# Altium footprint library JL_PCB.PCBLIB: 1129 footprints (part 50 of 72)
Each footprint in its own frame and in the unit in brackets; x right, y up, seen from the top. Pads: shape width x height; smd on the part's side, far side on the other; paste and mask are expansions set on the pad; w line width, h text height; cw(c..) or ccw(c..) is an arc to the next point about the centre after c.
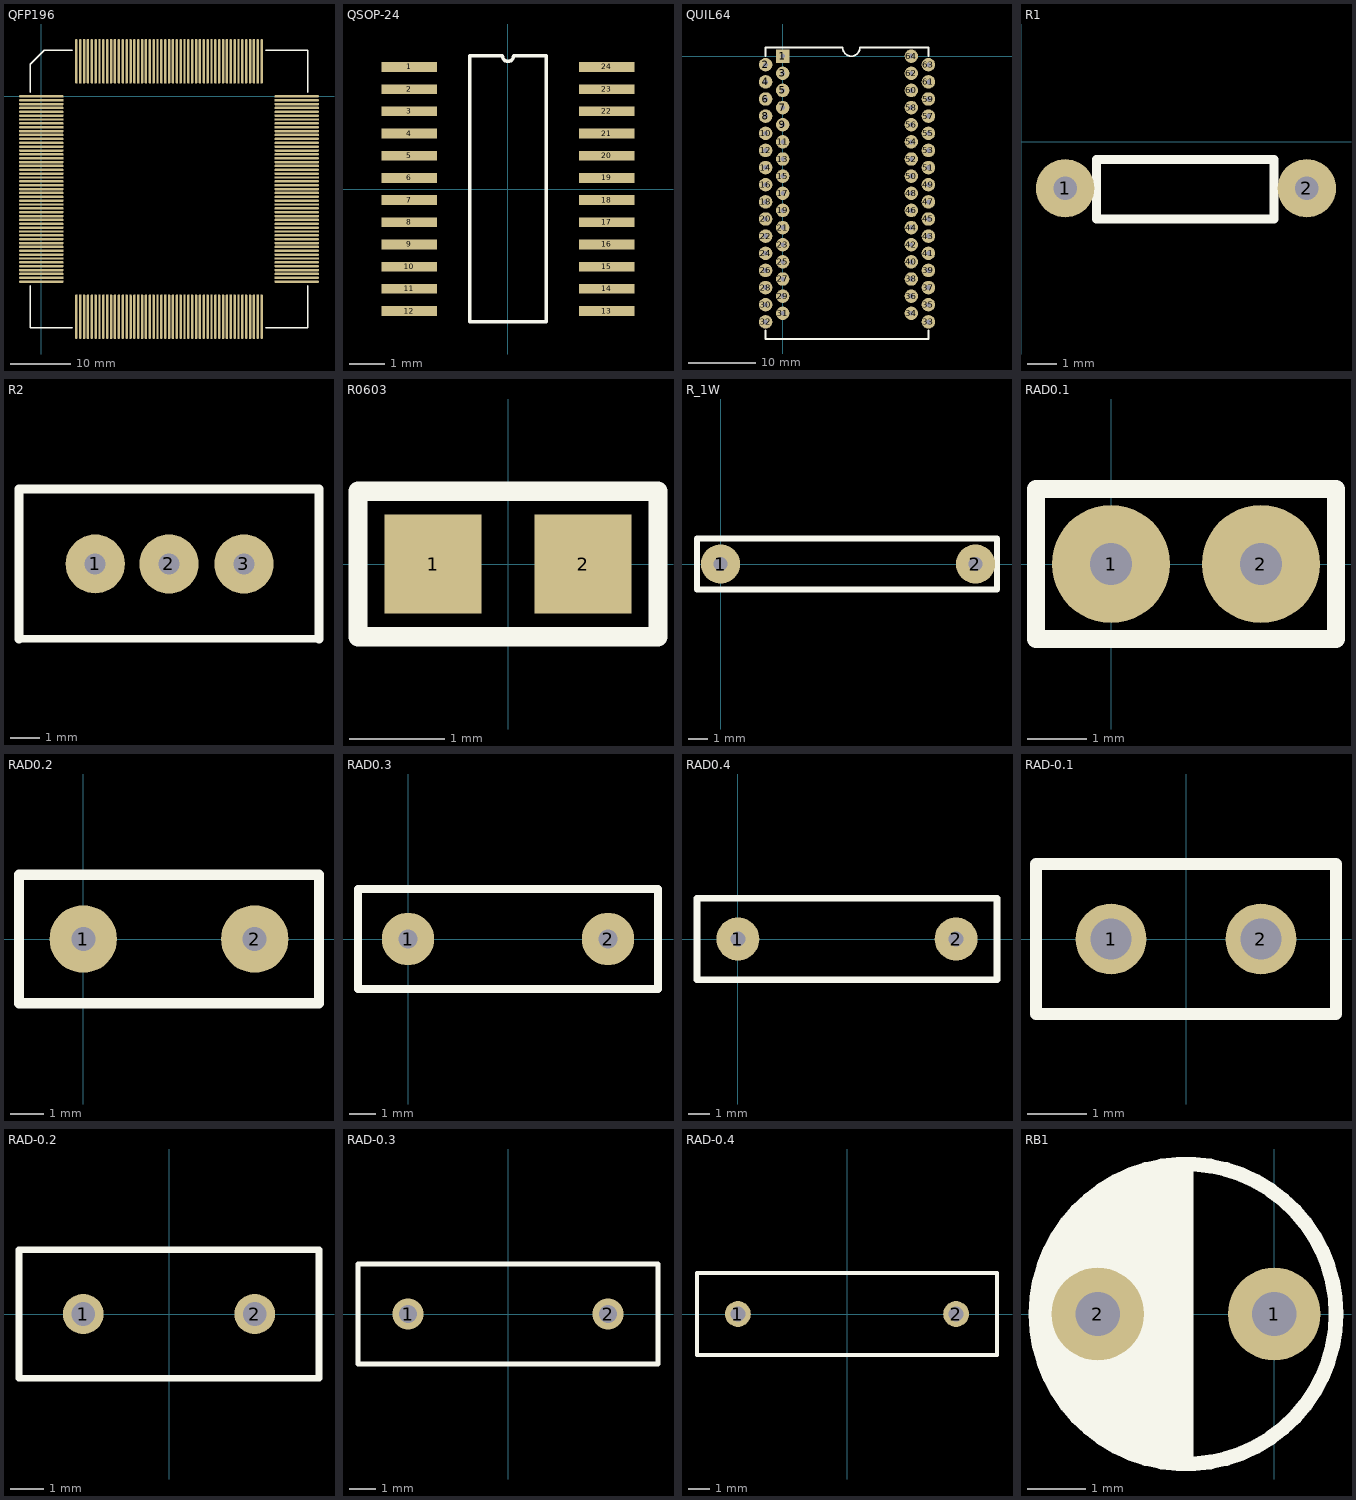
[diagram p49: the footprints below, top view; thin cyan lines are the x and y axes]

## QFP196 [mil]
pads (196):
  oval 290x16 smd: 1(0,0) 2(0,-25) 3(0,-50) 4(0,-75) 5(0,-100) 6(0,-125) 7(0,-150) 8(0,-175) 9(0,-200) 10(0,-225) 11(0,-250) 12(0,-275) 13(0,-301) 14(0,-326) 15(0,-351) 16(0,-376) 17(0,-401) 18(0,-426) 19(0,-451) 20(0,-476) 21(0,-501) 22(0,-526) 23(0,-551) 24(0,-576) 25(0,-601) 26(0,-626) 27(0,-651) 28(0,-676) 29(0,-701) 30(0,-726) 31(0,-751) 32(0,-776) 33(0,-801) 34(0,-826) 35(0,-851) 36(0,-876) 37(0,-901) 38(0,-926) 39(0,-951) 40(0,-976) 41(0,-1001) 42(0,-1026) 43(0,-1051) 44(0,-1076) 45(0,-1101) 46(0,-1126) 47(0,-1151) 48(0,-1176) 49(0,-1201) 99(1655,-1201) 100(1655,-1176) 101(1655,-1151) 102(1655,-1126) 103(1655,-1101) 104(1655,-1076) 105(1655,-1051) 106(1655,-1026) 107(1655,-1001) 108(1655,-976) 109(1655,-951) 110(1655,-926) 111(1655,-901) 112(1655,-876) 113(1655,-851) 114(1655,-826) 115(1655,-801) 116(1655,-776) 117(1655,-751) 118(1655,-726) 119(1655,-701) 120(1655,-676) 121(1655,-651) 122(1655,-626) 123(1655,-601) 124(1655,-576) 125(1655,-551) 126(1655,-526) 127(1655,-501) 128(1655,-476) 129(1655,-451) 130(1655,-426) 131(1655,-401) 132(1655,-376) 133(1655,-351) 134(1655,-326) 135(1655,-301) 136(1655,-275) 137(1655,-250) 138(1655,-225) 139(1655,-200) 140(1655,-175) 141(1655,-150) 142(1655,-125) 143(1655,-100) 144(1655,-75) 145(1655,-50) 146(1655,-25) 147(1655,0)
  oval 16x290 smd: 50(227,-1428) 51(252,-1428) 52(277,-1428) 53(302,-1428) 54(327,-1428) 55(352,-1428) 56(377,-1428) 57(402,-1428) 58(427,-1428) 59(452,-1428) 60(477,-1428) 61(502,-1428) 62(528,-1428) 63(553,-1428) 64(578,-1428) 65(603,-1428) 66(628,-1428) 67(653,-1428) 68(678,-1428) 69(703,-1428) 70(728,-1428) 71(753,-1428) 72(778,-1428) 73(803,-1428) 74(828,-1428) 75(853,-1428) 76(878,-1428) 77(903,-1428) 78(928,-1428) 79(953,-1428) 80(978,-1428) 81(1003,-1428) 82(1028,-1428) 83(1053,-1428) 84(1078,-1428) 85(1103,-1428) 86(1128,-1428) 87(1153,-1428) 88(1178,-1428) 89(1203,-1428) 90(1228,-1428) 91(1253,-1428) 92(1278,-1428) 93(1303,-1428) 94(1328,-1428) 95(1353,-1428) 96(1378,-1428) 97(1403,-1428) 98(1428,-1428) 148(1428,227) 149(1403,227) 150(1378,227) 151(1353,227) 152(1328,227) 153(1303,227) 154(1278,227) 155(1253,227) 156(1228,227) 157(1203,227) 158(1178,227) 159(1153,227) 160(1128,227) 161(1103,227) 162(1078,227) 163(1053,227) 164(1028,227) 165(1003,227) 166(978,227) 167(953,227) 168(928,227) 169(903,227) 170(878,227) 171(853,227) 172(828,227) 173(803,227) 174(778,227) 175(753,227) 176(728,227) 177(703,227) 178(678,227) 179(653,227) 180(628,227) 181(603,227) 182(578,227) 183(553,227) 184(528,227) 185(502,227) 186(477,227) 187(452,227) 188(427,227) 189(402,227) 190(377,227) 191(352,227) 192(327,227) 193(302,227) 194(277,227) 195(252,227) 196(227,227)
TopOverlay:
  lines w10: -72,-1228 -72,-1500 200,-1500 ; -72,27 -72,209 18,299 200,299 ; 1455,-1500 1727,-1500 1727,-1228 ; 1455,299 1727,299 1727,27

## QSOP-24 [mm] "SOP, 24-Leads, Body 8.9x4.1mm (max), Pitch 0.63mm, IPC Medium Density"
height 1.75
pads (24):
  rect 1.6x0.28 smd: 1(-2.825,3.493) 2(-2.825,2.857) 3(-2.825,2.223) 4(-2.825,1.588) 5(-2.825,0.952) 6(-2.825,0.318) 7(-2.825,-0.318) 8(-2.825,-0.953) 9(-2.825,-1.587) 10(-2.825,-2.223) 11(-2.825,-2.857) 12(-2.825,-3.493) 13(2.825,-3.492) 14(2.825,-2.857) 15(2.825,-2.222) 16(2.825,-1.587) 17(2.825,-0.953) 18(2.825,-0.318) 19(2.825,0.318) 20(2.825,0.953) 21(2.825,1.587) 22(2.825,2.222) 23(2.825,2.858) 24(2.825,3.493)
TopOverlay:
  lines w0.1: -1.09,-3.805 1.09,-3.805 1.09,3.81 0.159,3.81 cw(c0,3.81) -0.159,3.81 -1.09,3.81 -1.09,-3.805

## QUIL64 [mm]
pads (64):
  rect 2x2 hole 0.711: 1(0,0)
  round 2 hole 0.711: 2(-2.54,-1.27) 3(0,-2.54) 4(-2.54,-3.81) 5(0,-5.08) 6(-2.54,-6.35) 7(0,-7.62) 8(-2.54,-8.89) 9(0,-10.16) 10(-2.54,-11.43) 11(0,-12.7) 12(-2.54,-13.97) 13(0,-15.24) 14(-2.54,-16.51) 15(0,-17.78) 16(-2.54,-19.05) 17(0,-20.32) 18(-2.54,-21.59) 19(0,-22.86) 20(-2.54,-24.13) 21(0,-25.4) 22(-2.54,-26.67) 23(0,-27.94) 24(-2.54,-29.21) 25(0,-30.48) 26(-2.54,-31.75) 27(0,-33.02) 28(-2.54,-34.29) 29(0,-35.56) 30(-2.54,-36.83) 31(0,-38.1) 32(-2.54,-39.37) 33(21.59,-39.37) 34(19.05,-38.1) 35(21.59,-36.83) 36(19.05,-35.56) 37(21.59,-34.29) 38(19.05,-33.02) 39(21.59,-31.75) 40(19.05,-30.48) 41(21.59,-29.21) 42(19.05,-27.94) 43(21.59,-26.67) 44(19.05,-25.4) 45(21.59,-24.13) 46(19.05,-22.86) 47(21.59,-21.59) 48(19.05,-20.32) 49(21.59,-19.05) 50(19.05,-17.78) 51(21.59,-16.51) 52(19.05,-15.24) 53(21.59,-13.97) 54(19.05,-12.7) 55(21.59,-11.43) 56(19.05,-10.16) 57(21.59,-8.89) 58(19.05,-7.62) 59(21.59,-6.35) 60(19.05,-5.08) 61(21.59,-3.81) 62(19.05,-2.54) 63(21.59,-1.27) 64(19.05,0)
TopOverlay:
  lines w0.254: 8.89,1.27 ccw(c10.16,1.27) 11.43,1.27
  lines w0.305: -2.54,-40.64 -2.54,-41.91 21.59,-41.91 21.59,-40.64 ; -2.54,0 -2.54,1.27 8.89,1.27 ; 11.43,1.27 21.59,1.27 21.59,0

## R1 [mm]
pads (2):
  round 2 hole 0.813: 1(1.5,-1.6) 2(9.8,-1.6)
TopOverlay:
  lines w0.305: 1.56,-1.632 2.576,-1.632 ; 8.672,-1.632 9.688,-1.632 ; 2.576,-2.648 2.576,-0.616 8.672,-0.616 8.672,-2.648 2.576,-2.648

## R2 [mm]
pads (3):
  round 2 hole 0.711: 1(297.73,114.81) 2(300.228,114.808) 3(302.768,114.808)
TopOverlay:
  lines w0.254: 295.148,112.268 305.308,112.268
  lines w0.305: 295.148,112.268 295.148,117.348 305.308,117.348 305.308,114.808 305.308,112.268

## R0603 [mil]
pads (2):
  rect 40x41 smd: 1(-31,0) 2(31,0)
TopOverlay:
  lines w8: -62,-30 62,-30 62,30 -62,30 -62,-30

## R_1W [mm]
pads (2):
  round 2 hole 0.711: 1(0,0) 2(13,0)
TopOverlay:
  lines w0.305: -1.205,-1.305 14.097,-1.305 14.097,1.305 -1.205,1.305 -1.205,-1.305

## RAD0.1 [mm]
pads (2):
  round 2 hole 0.711: 1(0,0) 2(2.54,0)
TopOverlay:
  lines w0.305: -1.27,-1.27 3.81,-1.27 3.81,1.27 -1.27,1.27 -1.27,-1.27
3D body "Cap 0_2in pitch.STEP": height 5.75, standoff -3.08, extent -1.48,-1.306 4.02,1.194

## RAD0.2 [mm]
pads (2):
  round 2 hole 0.711: 1(0,0) 2(5.08,0)
TopOverlay:
  lines w0.305: -1.905,-1.905 6.985,-1.905 6.985,1.905 -1.905,1.905 -1.905,-1.905

## RAD0.3 [mm]
pads (2):
  round 2 hole 0.711: 1(0,0) 2(7.62,0)
TopOverlay:
  lines w0.305: -1.905,-1.905 9.525,-1.905 9.525,1.905 -1.905,1.905 -1.905,-1.905

## RAD0.4 [mm]
pads (2):
  round 2 hole 0.711: 1(0,0) 2(10.16,0)
TopOverlay:
  lines w0.305: -1.905,-1.905 12.065,-1.905 12.065,1.905 -1.905,1.905 -1.905,-1.905

## RAD-0.1 [mm] "Radial Cap, Thru-Hole; 2 Leads; 0.1 in Pin Spacing"
pads (2):
  round 1.2 hole 0.7: 1(-1.27,0) 2(1.27,0)
TopOverlay:
  lines w0.2: -2.54,-1.27 2.54,-1.27 2.54,1.27 -2.54,1.27 -2.54,-1.27

## RAD-0.2 [mm] "Radial Cap, Thru-Hole; 2 Leads; 0.2 in Pin Spacing"
pads (2):
  round 1.2 hole 0.7: 1(-2.54,0) 2(2.54,0)
TopOverlay:
  lines w0.2: -4.445,-1.905 4.445,-1.905 4.445,1.905 -4.445,1.905 -4.445,-1.905

## RAD-0.3 [mm] "Radial Cap, Thru-Hole; 2 Leads; 0.3 in Pin Spacing"
height 6
pads (2):
  round 1.2 hole 0.7: 1(-3.81,0) 2(3.81,0)
TopOverlay:
  lines w0.2: -5.715,-1.905 -5.715,1.905 5.715,1.905 5.715,-1.905 -5.715,-1.905

## RAD-0.4 [mm] "Radial Cap, Thru-Hole; 2 Leads; 0.4 in Pin Spacing"
pads (2):
  round 1.2 hole 0.7: 1(-5.08,0) 2(5.08,0)
TopOverlay:
  lines w0.2: -6.985,-1.905 6.985,-1.905 6.985,1.905 -6.985,1.905 -6.985,-1.905

## RB1 [mm]
pads (2):
  round 1.6 hole 0.762: 1(0,0) 2(-3.048,0)
TopOverlay:
  circle w0.254: c-1.524,0 r2.59
  rectangle: -2.032,-2.54 -1.524,2.54
  rectangle: -3.556,-1.524 -1.524,1.524
  lines w0.254: -1.524,-2.54 -1.524,2.54
  lines w1: -2.032,-2.032 cw(c-1.524,0) -2.032,2.032